# Altium footprint library SMT.PcbLib: 379 footprints (part 12 of 24)
Each footprint in its own frame and in the unit in brackets; x right, y up, seen from the top. Pads: shape width x height; smd on the part's side, far side on the other; paste and mask are expansions set on the pad; w line width, h text height; cw(c..) or ccw(c..) is an arc to the next point about the centre after c.
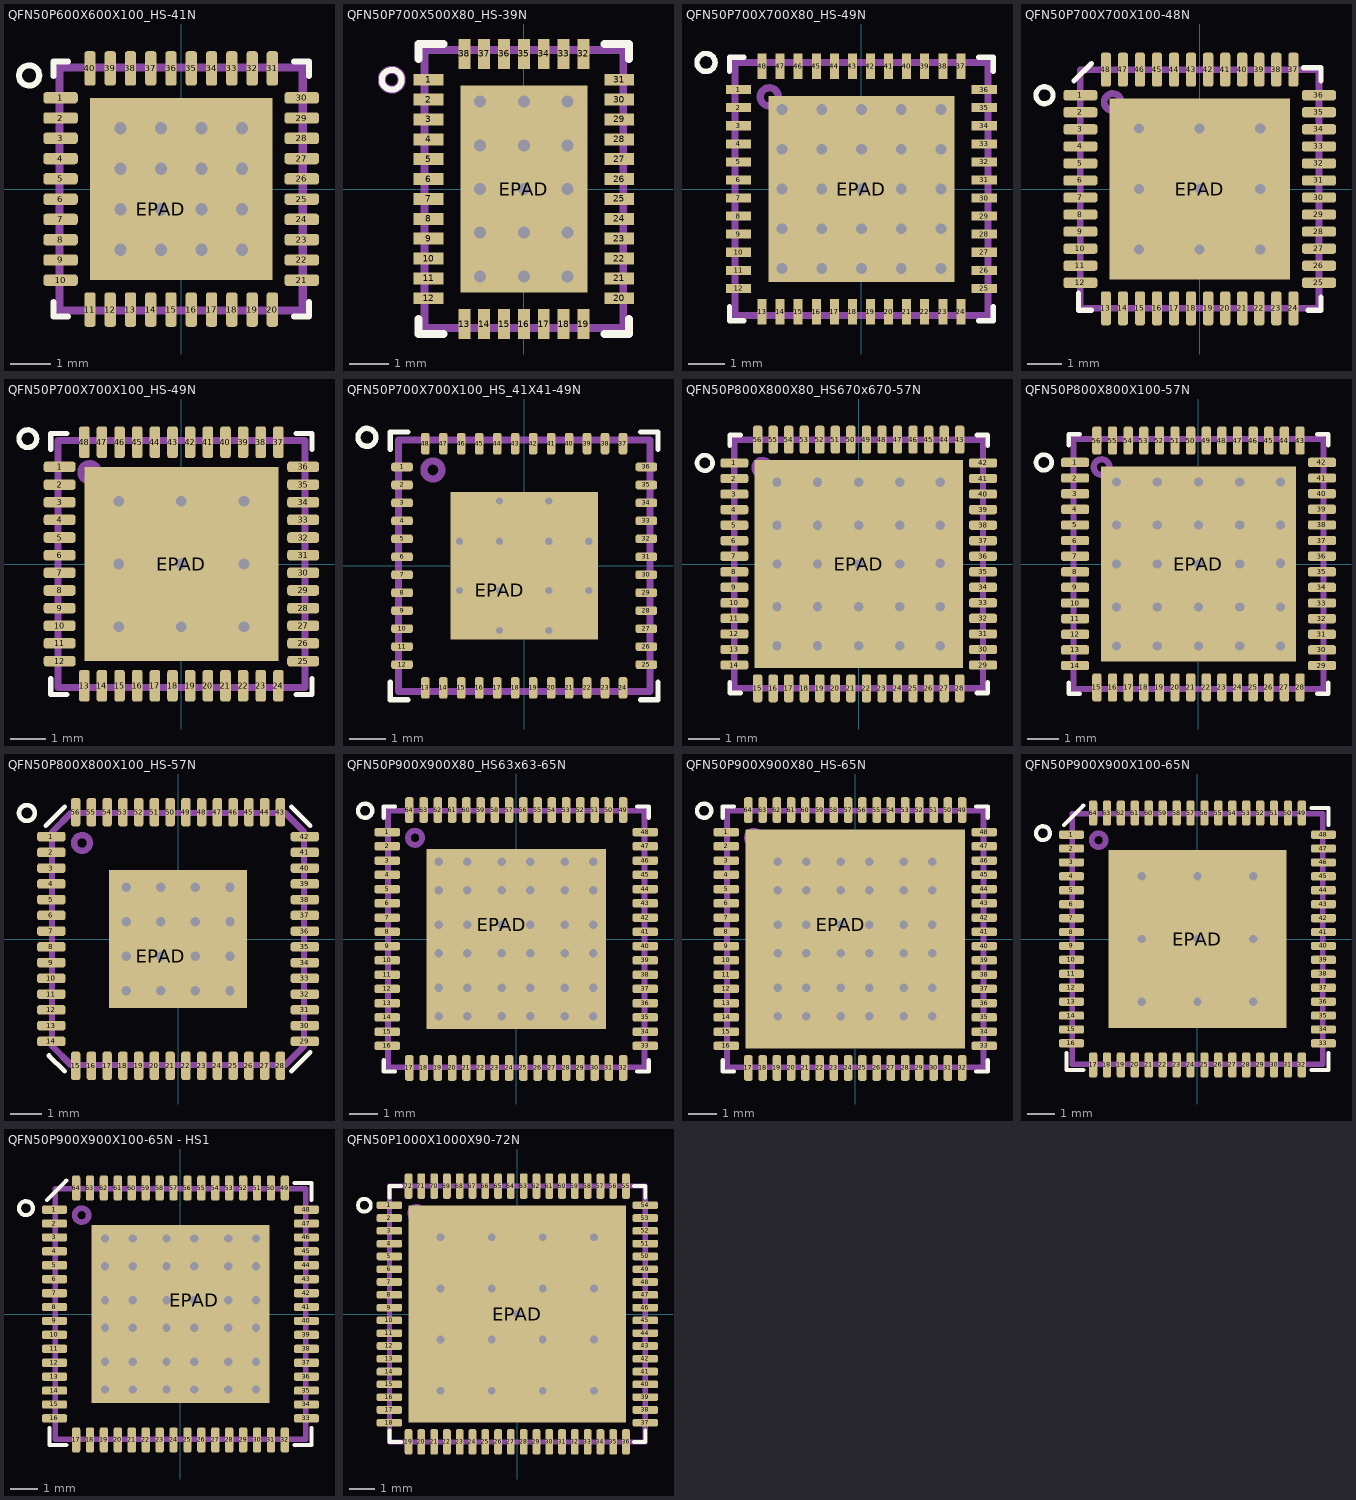
[diagram p11: the footprints below, top view; thin cyan lines are the x and y axes]

## QFN50P600X600X100_HS-41N [mm] "QFN, 40-Leads, Body 6,00x6,00mm, Pitch 0,50mm, Thermal Pad 4,50x4,50mm, IPC Medium Density"
height 1
pads (41):
  rrect50% 0.85x0.28 smd paste-0.025 mask+0.04: 1(-2.975,2.25) 2(-2.975,1.75) 3(-2.975,1.25) 4(-2.975,0.75) 5(-2.975,0.25) 6(-2.975,-0.25) 7(-2.975,-0.75) 8(-2.975,-1.25) 9(-2.975,-1.75) 10(-2.975,-2.25) 21(2.975,-2.25) 22(2.975,-1.75) 23(2.975,-1.25) 24(2.975,-0.75) 25(2.975,-0.25) 26(2.975,0.25) 27(2.975,0.75) 28(2.975,1.25) 29(2.975,1.75) 30(2.975,2.25)
  rrect50% 0.28x0.85 smd paste-0.025 mask+0.04: 11(-2.25,-2.975) 12(-1.75,-2.975) 13(-1.25,-2.975) 14(-0.75,-2.975) 15(-0.25,-2.975) 16(0.25,-2.975) 17(0.75,-2.975) 18(1.25,-2.975) 19(1.75,-2.975) 20(2.25,-2.975) 31(2.25,2.975) 32(1.75,2.975) 33(1.25,2.975) 34(0.75,2.975) 35(0.25,2.975) 36(-0.25,2.975) 37(-0.75,2.975) 38(-1.25,2.975) 39(-1.75,2.975) 40(-2.25,2.975)
  rect 4.5x4.5 hole 0.3 copper offset 0.5,0.5 paste-20 mask-20: EPAD(-0.5,-0.5)
via 1.5,-1.5 diameter 0.7 hole 0.3
via 0.5,-1.5 diameter 0.7 hole 0.3
via -0.5,-1.5 diameter 0.7 hole 0.3
via -1.5,-1.5 diameter 0.7 hole 0.3
via 1.5,-0.5 diameter 0.7 hole 0.3
via 0.5,-0.5 diameter 0.7 hole 0.3
via -1.5,-0.5 diameter 0.7 hole 0.3
via 1.5,0.5 diameter 0.7 hole 0.3
via 0.5,0.5 diameter 0.7 hole 0.3
via -0.5,0.5 diameter 0.7 hole 0.3
via -1.5,0.5 diameter 0.7 hole 0.3
via 1.5,1.5 diameter 0.7 hole 0.3
via 0.5,1.5 diameter 0.7 hole 0.3
via -0.5,1.5 diameter 0.7 hole 0.3
via -1.5,1.5 diameter 0.7 hole 0.3
Top Overlay:
  circle w0.15: c-3.75,2.8 r0.25
  lines w0.15: -3.15,-2.79 -3.15,-3.15 -2.79,-3.15 ; -3.15,2.79 -3.15,3.15 -2.79,3.15 ; 2.79,-3.15 3.15,-3.15 3.15,-2.79 ; 2.79,3.15 3.15,3.15 3.15,2.79
Top Paste:
  rectangle: -0.6,-0.6 0.6,0.6
  rectangle: -0.6,0.9 0.6,2.1
  rectangle: -0.6,-2.1 0.6,-0.9
  rectangle: -2.1,-2.1 -0.9,-0.9
  rectangle: -2.1,0.9 -0.9,2.1
  rectangle: -2.1,-0.6 -0.9,0.6
  rectangle: 0.9,-2.1 2.1,-0.9
  rectangle: 0.9,0.9 2.1,2.1
  rectangle: 0.9,-0.6 2.1,0.6
Top Solder:
  rectangle: -2.15,-2.15 -0.85,-0.85
  rectangle: -0.65,-2.15 0.65,-0.85
  rectangle: 0.85,-2.15 2.15,-0.85
  rectangle: -0.65,-0.65 0.65,0.65
  rectangle: -0.65,0.85 0.65,2.15
  rectangle: -2.15,0.85 -0.85,2.15
  region: -0.85,-0.65 -0.85,0.65 -2.15,0.65 -2.15,-0.65
  region: 2.15,-0.65 2.15,0.65 0.85,0.65 0.85,-0.65
  region: 2.15,2.15 0.85,2.15 0.85,0.85 2.15,0.85
Mechanical 1:
  circle w0.2: c-1.55,1.55 r0.25
  lines w0.2: -3,-3 3,-3 3,3 -3,3 -3,-3
3D body "QFN50P600X600X100_HS-41N.step": height 1, standoff 0, extent -3.001,-3.001 3.001,3.001

## QFN50P700X500X80_HS-39N [mm] "QFN, 38-Leads, Body 7,00x5,00mm, Pitch 0,50mm, Thermal Pad 5,15x3,15mm, IPC Medium Density"
height 0.8
pads (39):
  rect 0.75x0.3 smd mask+0.05: 1(-2.4,2.75) 2(-2.4,2.25) 3(-2.4,1.75) 4(-2.4,1.25) 5(-2.4,0.75) 6(-2.4,0.25) 7(-2.4,-0.25) 8(-2.4,-0.75) 9(-2.4,-1.25) 10(-2.4,-1.75) 11(-2.4,-2.25) 12(-2.4,-2.75) 20(2.4,-2.75) 21(2.4,-2.25) 22(2.4,-1.75) 23(2.4,-1.25) 24(2.4,-0.75) 25(2.4,-0.25) 26(2.4,0.25) 27(2.4,0.75) 28(2.4,1.25) 29(2.4,1.75) 30(2.4,2.25) 31(2.4,2.75)
  rect 0.3x0.75 smd mask+0.05: 13(-1.5,-3.4) 14(-1,-3.4) 15(-0.5,-3.4) 16(0,-3.4) 17(0.5,-3.4) 18(1,-3.4) 19(1.5,-3.4) 32(1.5,3.4) 33(1,3.4) 34(0.5,3.4) 35(0,3.4) 36(-0.5,3.4) 37(-1,3.4) 38(-1.5,3.4)
  rect 3.2x5.2 hole 0.3 mask+0.05: EPAD(0,0)
via -1.1,-2.2 diameter 0.7 hole 0.3
via -1.1,-1.1 diameter 0.7 hole 0.3
via -1.1,0 diameter 0.7 hole 0.3
via -1.1,1.1 diameter 0.7 hole 0.3
via -1.1,2.2 diameter 0.7 hole 0.3
via 0,-2.2 diameter 0.7 hole 0.3
via 0,-1.1 diameter 0.7 hole 0.3
via 0,1.1 diameter 0.7 hole 0.3
via 0,2.2 diameter 0.7 hole 0.3
via 1.1,-2.2 diameter 0.7 hole 0.3
via 1.1,-1.1 diameter 0.7 hole 0.3
via 1.1,0 diameter 0.7 hole 0.3
via 1.1,1.1 diameter 0.7 hole 0.3
via 1.1,2.2 diameter 0.7 hole 0.3
Top Overlay:
  circle w0.15: c-3.325,2.75 r0.25
  lines w0.2: -2.65,-3.275 -2.65,-3.65 -2.025,-3.65 ; -2.65,3.275 -2.65,3.65 -2.025,3.65 ; 2.025,-3.65 2.65,-3.65 2.65,-3.275 ; 2.025,3.65 2.65,3.65 2.65,3.275
Top Paste:
  region: -0.2,-1.225 -0.2,-0.1 -1.275,-0.1 -1.275,-1.225
  region: -0.2,-2.55 -0.2,-1.425 -1.275,-1.425 -1.275,-2.55
  region: 1.275,-1.225 1.275,-0.1 0.2,-0.1 0.2,-1.225
  region: 0.2,1.225 0.2,0.1 1.275,0.1 1.275,1.225
  region: -1.275,1.228 -1.275,0.103 -0.2,0.103 -0.2,1.228
  region: 1.275,-2.55 1.275,-1.425 0.2,-1.425 0.2,-2.55
  region: 0.2,2.55 0.2,1.425 1.275,1.425 1.275,2.55
  region: -1.275,2.553 -1.275,1.428 -0.2,1.428 -0.2,2.553
Mechanical 1:
  circle w0.2: c-3.325,2.75 r0.25
  lines w0.2: -2.5,-3.5 2.5,-3.5 2.5,3.5 -2.5,3.5 -2.5,-3.5
3D body "QFN50P700X500X80_HS-39N.step": height 0.8, standoff 0, extent -2.501,-3.501 2.501,3.501

## QFN50P700X700X80_HS-49N [mm] "QFN, 48-Leads, Body 7,00x7,00mm, Pitch 0,50mm, Thermal Pad 5,15x5,15mm, IPC Medium Density"
height 0.8
pads (49):
  rect 0.7x0.25 smd mask+0.05: 1(-3.4,2.75) 2(-3.4,2.25) 3(-3.4,1.75) 4(-3.4,1.25) 5(-3.4,0.75) 6(-3.4,0.25) 7(-3.4,-0.25) 8(-3.4,-0.75) 9(-3.4,-1.25) 10(-3.4,-1.75) 11(-3.4,-2.25) 12(-3.4,-2.75) 25(3.4,-2.75) 26(3.4,-2.25) 27(3.4,-1.75) 28(3.4,-1.25) 29(3.4,-0.75) 30(3.4,-0.25) 31(3.4,0.25) 32(3.4,0.75) 33(3.4,1.25) 34(3.4,1.75) 35(3.4,2.25) 36(3.4,2.75)
  rect 0.25x0.7 smd mask+0.05: 13(-2.75,-3.4) 14(-2.25,-3.4) 15(-1.75,-3.4) 16(-1.25,-3.4) 17(-0.75,-3.4) 18(-0.25,-3.4) 19(0.25,-3.4) 20(0.75,-3.4) 21(1.25,-3.4) 22(1.75,-3.4) 23(2.25,-3.4) 24(2.75,-3.4) 37(2.75,3.4) 38(2.25,3.4) 39(1.75,3.4) 40(1.25,3.4) 41(0.75,3.4) 42(0.25,3.4) 43(-0.25,3.4) 44(-0.75,3.4) 45(-1.25,3.4) 46(-1.75,3.4) 47(-2.25,3.4) 48(-2.75,3.4)
  rect 5.15x5.15 hole 0.3: EPAD(0,0)
via 2.2,-2.2 diameter 0.6 hole 0.3
via 1.1,-2.2 diameter 0.6 hole 0.3
via 0,-2.2 diameter 0.6 hole 0.3
via -1.1,-2.2 diameter 0.6 hole 0.3
via -2.2,-2.2 diameter 0.6 hole 0.3
via 2.2,-1.1 diameter 0.6 hole 0.3
via 1.1,-1.1 diameter 0.6 hole 0.3
via 0,-1.1 diameter 0.6 hole 0.3
via -1.1,-1.1 diameter 0.6 hole 0.3
via -2.2,-1.1 diameter 0.6 hole 0.3
via 2.2,0 diameter 0.6 hole 0.3
via 1.1,0 diameter 0.6 hole 0.3
via -1.1,0 diameter 0.6 hole 0.3
via -2.2,0 diameter 0.6 hole 0.3
via 2.2,1.1 diameter 0.6 hole 0.3
via 1.1,1.1 diameter 0.6 hole 0.3
via 0,1.1 diameter 0.6 hole 0.3
via -1.1,1.1 diameter 0.6 hole 0.3
via -2.2,1.1 diameter 0.6 hole 0.3
via 2.2,2.2 diameter 0.6 hole 0.3
via 1.1,2.2 diameter 0.6 hole 0.3
via 0,2.2 diameter 0.6 hole 0.3
via -1.1,2.2 diameter 0.6 hole 0.3
via -2.2,2.2 diameter 0.6 hole 0.3
Top Overlay:
  circle w0.15: c-4.3,3.5 r0.25
  lines w0.15: -3.65,-3.25 -3.65,-3.65 -3.25,-3.65 ; -3.65,3.25 -3.65,3.65 -3.25,3.65 ; 3.25,-3.65 3.65,-3.65 3.65,-3.25 ; 3.25,3.65 3.65,3.65 3.65,3.25
Top Paste:
  rectangle: -2.3,-2.3 -0.5,-0.5
  region: 2.3,-0.5 0.5,-0.5 0.5,-2.3 2.3,-2.3
  region: 2.3,2.3 0.5,2.3 0.5,0.5 2.3,0.5
  rectangle: -2.3,0.5 -0.5,2.3
Top Solder:
  rectangle: -2.6,-2.6 -0.2,-0.2
  region: 2.6,-0.2 0.2,-0.2 0.2,-2.6 2.6,-2.6
  region: 2.6,2.6 0.2,2.6 0.2,0.2 2.6,0.2
  rectangle: -2.6,0.2 -0.2,2.6
Mechanical 1:
  circle w0.2: c-2.55,2.55 r0.25
  lines w0.2: -3.5,-3.5 3.5,-3.5 3.5,3.5 -3.5,3.5 -3.5,-3.5
3D body "QFN50P700X700X80_HS-49N.step": height 0.8, standoff 0, extent -3.501,-3.501 3.501,3.501

## QFN50P700X700X100-48N [mm] "QFN, 48-Leads, Body 7,0x7,0mm (max), Pitch 0,50mm, IPC Medium Density"
height 1
pads (49):
  rrect50% 1x0.3 smd mask+0.03: 1(-3.5,2.75) 2(-3.5,2.25) 3(-3.5,1.75) 4(-3.5,1.25) 5(-3.5,0.75) 6(-3.5,0.25) 7(-3.5,-0.25) 8(-3.5,-0.75) 9(-3.5,-1.25) 10(-3.5,-1.75) 11(-3.5,-2.25) 12(-3.5,-2.75) 25(3.5,-2.75) 26(3.5,-2.25) 27(3.5,-1.75) 28(3.5,-1.25) 29(3.5,-0.75) 30(3.5,-0.25) 31(3.5,0.25) 32(3.5,0.75) 33(3.5,1.25) 34(3.5,1.75) 35(3.5,2.25) 36(3.5,2.75)
  rrect50% 0.3x1 smd mask+0.03: 13(-2.75,-3.5) 14(-2.25,-3.5) 15(-1.75,-3.5) 16(-1.25,-3.5) 17(-0.75,-3.5) 18(-0.25,-3.5) 19(0.25,-3.5) 20(0.75,-3.5) 21(1.25,-3.5) 22(1.75,-3.5) 23(2.25,-3.5) 24(2.75,-3.5) 37(2.75,3.5) 38(2.25,3.5) 39(1.75,3.5) 40(1.25,3.5) 41(0.75,3.5) 42(0.25,3.5) 43(-0.25,3.5) 44(-0.75,3.5) 45(-1.25,3.5) 46(-1.75,3.5) 47(-2.25,3.5) 48(-2.75,3.5)
  rect 5.3x5.3 hole 0.3 paste-25 mask-25: EPAD(0,0)
via -1.775,1.775 diameter 0.8 hole 0.3
via 1.775,1.775 diameter 0.8 hole 0.3
via -1.775,-1.775 diameter 0.8 hole 0.3
via 1.775,-1.775 diameter 0.8 hole 0.3
via 1.775,0 diameter 0.8 hole 0.3
via -1.775,0 diameter 0.8 hole 0.3
via 0,1.775 diameter 0.8 hole 0.3
via 0,-1.775 diameter 0.8 hole 0.3
Top Overlay:
  circle w0.15: c-4.55,2.75 r0.25
  lines w0.15: -3.683,3.175 -3.175,3.683 ; -3.556,-3.048 -3.556,-3.556 -3.175,-3.556 ; 3.048,3.556 3.556,3.556 3.556,3.175 ; 3.175,-3.556 3.556,-3.556 3.556,-3.175
Top Paste:
  region: -1.1,1.125 -1.1,2.425 -2.4,2.425 -2.4,1.125
  region: 2.45,1.125 2.45,2.425 1.15,2.425 1.15,1.125
  region: -1.1,-2.425 -1.1,-1.125 -2.4,-1.125 -2.4,-2.425
  region: 2.45,-2.425 2.45,-1.125 1.15,-1.125 1.15,-2.425
  region: 2.45,-0.65 2.45,0.65 1.15,0.65 1.15,-0.65
  region: -1.1,-0.65 -1.1,0.65 -2.4,0.65 -2.4,-0.65
  region: 0.675,1.125 0.675,2.425 -0.625,2.425 -0.625,1.125
  region: 0.675,-0.65 0.675,0.65 -0.625,0.65 -0.625,-0.65
  region: 0.675,-2.425 0.675,-1.125 -0.625,-1.125 -0.625,-2.425
Top Solder:
  region: 2.55,1 2.55,2.5 1.05,2.5 1.05,1
  region: 0.775,1 0.775,2.5 -0.725,2.5 -0.725,1
  region: -1,1 -1,2.5 -2.5,2.5 -2.5,1
  region: -1,-0.775 -1,0.725 -2.5,0.725 -2.5,-0.775
  region: 0.775,-0.775 0.775,0.725 -0.725,0.725 -0.725,-0.775
  region: 2.55,-0.775 2.55,0.725 1.05,0.725 1.05,-0.775
  region: -1,-2.55 -1,-1.05 -2.5,-1.05 -2.5,-2.55
  region: 0.775,-2.55 0.775,-1.05 -0.725,-1.05 -0.725,-2.55
  region: 2.55,-2.55 2.55,-1.05 1.05,-1.05 1.05,-2.55
Bottom Solder:
  region: -2.65,2.65 -2.65,-2.65 2.65,-2.65 2.65,2.65
Mechanical 1:
  circle w0.2: c-2.55,2.55 r0.25
  lines w0.2: -3.5,-3.5 -3.5,3.5 3.5,3.5 3.5,-3.5 -3.5,-3.5
3D body "User Library-QFN48_7x7.STEP": height 0.78, standoff -0.02, extent -3.5,-3.52 3.52,3.5

## QFN50P700X700X100_HS-49N [mm] "QFN, 48-Leads, Body 7,00x7,00mm, Pitch 0,50mm, Thermal Pad 5,50x5,50mm, IPC Medium Density"
height 1
pads (49):
  rrect50% 0.9x0.3 smd mask+0.04: 1(-3.45,2.75) 2(-3.45,2.25) 3(-3.45,1.75) 4(-3.45,1.25) 5(-3.45,0.75) 6(-3.45,0.25) 7(-3.45,-0.25) 8(-3.45,-0.75) 9(-3.45,-1.25) 10(-3.45,-1.75) 11(-3.45,-2.25) 12(-3.45,-2.75) 25(3.45,-2.75) 26(3.45,-2.25) 27(3.45,-1.75) 28(3.45,-1.25) 29(3.45,-0.75) 30(3.45,-0.25) 31(3.45,0.25) 32(3.45,0.75) 33(3.45,1.25) 34(3.45,1.75) 35(3.45,2.25) 36(3.45,2.75)
  rrect50% 0.3x0.9 smd mask+0.04: 13(-2.75,-3.45) 14(-2.25,-3.45) 15(-1.75,-3.45) 16(-1.25,-3.45) 17(-0.75,-3.45) 18(-0.25,-3.45) 19(0.25,-3.45) 20(0.75,-3.45) 21(1.25,-3.45) 22(1.75,-3.45) 23(2.25,-3.45) 24(2.75,-3.45) 37(2.75,3.45) 38(2.25,3.45) 39(1.75,3.45) 40(1.25,3.45) 41(0.75,3.45) 42(0.25,3.45) 43(-0.25,3.45) 44(-0.75,3.45) 45(-1.25,3.45) 46(-1.75,3.45) 47(-2.25,3.45) 48(-2.75,3.45)
  rect 5.5x5.5 hole 0.3 paste-25 mask-25: EPAD(0,0)
via 0,1.775 diameter 0.7 hole 0.3
via 1.775,1.775 diameter 0.7 hole 0.3
via -1.775,0 diameter 0.7 hole 0.3
via 1.775,0 diameter 0.7 hole 0.3
via -1.775,-1.775 diameter 0.7 hole 0.3
via 0,-1.775 diameter 0.7 hole 0.3
via 1.775,-1.775 diameter 0.7 hole 0.3
via -1.775,1.775 diameter 0.7 hole 0.3
Top Overlay:
  circle w0.15: c-4.35,3.55 r0.25
  lines w0.15: -3.7,-3.25 -3.7,-3.7 -3.25,-3.7 ; -3.7,3.25 -3.7,3.7 -3.25,3.7 ; 3.25,-3.7 3.7,-3.7 3.7,-3.25 ; 3.25,3.7 3.7,3.7 3.7,3.25
Top Paste:
  region: 1.075,-1.075 2.475,-1.075 2.475,-2.475 1.075,-2.475
  region: -0.7,-1.075 0.7,-1.075 0.7,-2.475 -0.7,-2.475
  region: -2.475,-1.075 -1.075,-1.075 -1.075,-2.475 -2.475,-2.475
  region: 1.075,0.7 2.475,0.7 2.475,-0.7 1.075,-0.7
  region: -0.7,0.7 0.7,0.7 0.7,-0.7 -0.7,-0.7
  region: -2.475,0.7 -1.075,0.7 -1.075,-0.7 -2.475,-0.7
  region: 1.075,2.475 2.475,2.475 2.475,1.075 1.075,1.075
  region: -0.7,2.475 0.7,2.475 0.7,1.075 -0.7,1.075
  region: -2.475,2.475 -1.075,2.475 -1.075,1.075 -2.475,1.075
Top Solder:
  region: 0.95,-0.95 2.8,-0.95 2.8,-2.8 0.95,-2.8
  region: -0.825,-0.95 0.825,-0.95 0.825,-2.8 -0.825,-2.8
  region: -2.8,-0.95 -0.95,-0.95 -0.95,-2.8 -2.8,-2.8
  region: 0.95,0.825 2.8,0.825 2.8,-0.825 0.95,-0.825
  region: -0.825,0.825 0.825,0.825 0.825,-0.825 -0.825,-0.825
  region: -2.8,0.825 -0.95,0.825 -0.95,-0.825 -2.8,-0.825
  region: 0.95,2.8 2.8,2.8 2.8,0.95 0.95,0.95
  region: -0.825,2.8 0.825,2.8 0.825,0.95 -0.825,0.95
  region: -2.8,2.8 -0.95,2.8 -0.95,0.95 -2.8,0.95
Bottom Solder:
  region: -2.8,2.8 2.8,2.8 2.8,-2.8 -2.8,-2.8
Mechanical 1:
  circle w0.2: c-2.6,2.6 r0.25
  lines w0.2: -3.5,-3.5 -3.5,3.5 3.5,3.5 3.5,-3.5 -3.5,-3.5
3D body "QFN50P700X700X100_HS-49N.step": height 1, standoff 0, extent -3.57,-3.57 3.57,3.57

## QFN50P700X700X100_HS_41X41-49N [mm] "QFN, 48-Leads, Body 7,00x7,00mm, Pitch 0,50mm, Thermal Pad 4,10x4,10mm, IPC Medium Density"
height 1
pads (49):
  rrect50% 0.6x0.24 smd paste+0 mask+0.05: 1(-3.4,2.75) 2(-3.4,2.25) 3(-3.4,1.75) 4(-3.4,1.25) 5(-3.4,0.75) 6(-3.4,0.25) 7(-3.4,-0.25) 8(-3.4,-0.75) 9(-3.4,-1.25) 10(-3.4,-1.75) 11(-3.4,-2.25) 12(-3.4,-2.75) 25(3.4,-2.75) 26(3.4,-2.25) 27(3.4,-1.75) 28(3.4,-1.25) 29(3.4,-0.75) 30(3.4,-0.25) 31(3.4,0.25) 32(3.4,0.75) 33(3.4,1.25) 34(3.4,1.75) 35(3.4,2.25) 36(3.4,2.75)
  rrect50% 0.24x0.6 smd paste+0 mask+0.05: 13(-2.75,-3.4) 14(-2.25,-3.4) 15(-1.75,-3.4) 16(-1.25,-3.4) 17(-0.75,-3.4) 18(-0.25,-3.4) 19(0.25,-3.4) 20(0.75,-3.4) 21(1.25,-3.4) 22(1.75,-3.4) 23(2.25,-3.4) 24(2.75,-3.4) 37(2.75,3.4) 38(2.25,3.4) 39(1.75,3.4) 40(1.25,3.4) 41(0.75,3.4) 42(0.25,3.4) 43(-0.25,3.4) 44(-0.75,3.4) 45(-1.25,3.4) 46(-1.75,3.4) 47(-2.25,3.4) 48(-2.75,3.4)
  rect 4.1x4.1 hole 0.2 copper offset 0.685,0.685: EPAD(-0.685,-0.685)
via 1.8,-0.685 diameter 0.5 hole 0.2
via -1.8,-0.685 diameter 0.5 hole 0.2
via 0.685,-1.8 diameter 0.5 hole 0.2
via 0.685,-0.685 diameter 0.5 hole 0.2
via -0.685,-1.8 diameter 0.5 hole 0.2
via -0.685,1.8 diameter 0.5 hole 0.2
via 0.685,0.685 diameter 0.5 hole 0.2
via 0.685,1.8 diameter 0.5 hole 0.2
via -1.8,0.685 diameter 0.5 hole 0.2
via 1.8,0.685 diameter 0.5 hole 0.2
via -0.685,0.685 diameter 0.5 hole 0.2
Top Overlay:
  circle w0.15: c-4.375,3.575 r0.25
  lines w0.15: -3.725,-3.245 -3.725,-3.725 -3.245,-3.725 ; -3.725,3.245 -3.725,3.725 -3.245,3.725 ; 3.245,-3.725 3.725,-3.725 3.725,-3.245 ; 3.245,3.725 3.725,3.725 3.725,3.245
Top Paste:
  rectangle: -0.585,-0.59 0.585,0.58
  rectangle: -0.585,-1.95 0.585,-0.78
  rectangle: -0.585,0.78 0.585,1.95
  rectangle: 0.785,-1.95 1.955,-0.78
  rectangle: 0.785,0.78 1.955,1.95
  rectangle: 0.785,-0.59 1.955,0.58
  region: -0.785,0.58 -1.955,0.58 -1.955,-0.59 -0.785,-0.59
  region: -0.785,1.95 -1.955,1.95 -1.955,0.78 -0.785,0.78
  region: -0.785,-0.78 -1.955,-0.78 -1.955,-1.95 -0.785,-1.95
Mechanical 1:
  circle w0.2: c-2.54,2.667 r0.25
  lines w0.2: -3.5,-3.5 -3.5,3.5 3.5,3.5 3.5,-3.5 -3.5,-3.5
3D body "QFN50P700X700X100_HS-49N.step": height 1, standoff 0, extent -3.501,-3.501 3.501,3.501

## QFN50P800X800X80_HS670x670-57N [mm] "QFN, 56-Leads, Body 8,00x8,00mm, Pitch 0,50mm, Thermal Pad 6,7x6,7mm, IPC Medium Density"
height 0.8
pads (57):
  rrect50% 0.9x0.3 smd mask+0.03: 1(-4,3.25) 2(-4,2.75) 3(-4,2.25) 4(-4,1.75) 5(-4,1.25) 6(-4,0.75) 7(-4,0.25) 8(-4,-0.25) 9(-4,-0.75) 10(-4,-1.25) 11(-4,-1.75) 12(-4,-2.25) 13(-4,-2.75) 14(-4,-3.25) 29(4,-3.25) 30(4,-2.75) 31(4,-2.25) 32(4,-1.75) 33(4,-1.25) 34(4,-0.75) 35(4,-0.25) 36(4,0.25) 37(4,0.75) 38(4,1.25) 39(4,1.75) 40(4,2.25) 41(4,2.75) 42(4,3.25)
  rrect50% 0.3x0.9 smd mask+0.03: 15(-3.25,-4) 16(-2.75,-4) 17(-2.25,-4) 18(-1.75,-4) 19(-1.25,-4) 20(-0.75,-4) 21(-0.25,-4) 22(0.25,-4) 23(0.75,-4) 24(1.25,-4) 25(1.75,-4) 26(2.25,-4) 27(2.75,-4) 28(3.25,-4) 43(3.25,4) 44(2.75,4) 45(2.25,4) 46(1.75,4) 47(1.25,4) 48(0.75,4) 49(0.25,4) 50(-0.25,4) 51(-0.75,4) 52(-1.25,4) 53(-1.75,4) 54(-2.25,4) 55(-2.75,4) 56(-3.25,4)
  rect 6.7x6.7 hole 0.3 paste+0 mask-5: EPAD(0,0)
via 2.625,0.025 diameter 0.6 hole 0.3
via 1.325,0 diameter 0.6 hole 0.3
via 2.625,2.625 diameter 0.6 hole 0.3
via 2.625,-2.625 diameter 0.6 hole 0.3
via 2.625,-1.375 diameter 0.6 hole 0.3
via 2.625,1.25 diameter 0.6 hole 0.3
via 1.325,2.625 diameter 0.6 hole 0.3
via 1.325,-2.625 diameter 0.6 hole 0.3
via 1.325,-1.375 diameter 0.6 hole 0.3
via 1.325,1.25 diameter 0.6 hole 0.3
via 0,1.25 diameter 0.6 hole 0.3
via 0,-1.375 diameter 0.6 hole 0.3
via -2.625,-1.375 diameter 0.6 hole 0.3
via -2.625,1.25 diameter 0.6 hole 0.3
via -1.325,2.625 diameter 0.6 hole 0.3
via -1.325,0 diameter 0.6 hole 0.3
via -1.325,-1.375 diameter 0.6 hole 0.3
via -2.625,2.625 diameter 0.6 hole 0.3
via -2.625,-2.625 diameter 0.6 hole 0.3
via 0,-2.625 diameter 0.6 hole 0.3
via 0,2.625 diameter 0.6 hole 0.3
via -2.625,0 diameter 0.6 hole 0.3
via -1.325,-2.625 diameter 0.6 hole 0.3
via -1.325,1.25 diameter 0.6 hole 0.3
Top Overlay:
  circle w0.15: c-4.95,3.25 r0.25
  lines w0.15: -4.15,-3.8 -4.15,-4.15 -3.8,-4.15 ; -4.15,3.8 -4.15,4.15 -3.8,4.15 ; 3.8,-4.15 4.15,-4.15 4.15,-3.8 ; 3.8,4.15 4.15,4.15 4.15,3.8
Top Paste:
  region: 3.075,-0.45 3.075,0.45 2.175,0.45 2.175,-0.45
  region: 3.075,2.175 3.075,3.075 2.175,3.075 2.175,2.175
  region: 3.075,-3.075 3.075,-2.175 2.175,-2.175 2.175,-3.075
  region: 3.075,-1.825 3.075,-0.925 2.175,-0.925 2.175,-1.825
  region: 3.075,0.8 3.075,1.7 2.175,1.7 2.175,0.8
  region: 1.775,-0.45 1.775,0.45 0.875,0.45 0.875,-0.45
  region: 1.775,2.175 1.775,3.075 0.875,3.075 0.875,2.175
  region: 1.775,-3.075 1.775,-2.175 0.875,-2.175 0.875,-3.075
  region: 1.775,-1.825 1.775,-0.925 0.875,-0.925 0.875,-1.825
  region: 1.775,0.8 1.775,1.7 0.875,1.7 0.875,0.8
  region: 0.45,0.8 0.45,1.7 -0.45,1.7 -0.45,0.8
  region: 0.45,-1.825 0.45,-0.925 -0.45,-0.925 -0.45,-1.825
  region: -2.175,-1.825 -2.175,-0.925 -3.075,-0.925 -3.075,-1.825
  region: -2.175,0.8 -2.175,1.7 -3.075,1.7 -3.075,0.8
  region: -0.875,2.175 -0.875,3.075 -1.775,3.075 -1.775,2.175
  region: -0.875,-0.45 -0.875,0.45 -1.775,0.45 -1.775,-0.45
  region: -0.875,-1.825 -0.875,-0.925 -1.775,-0.925 -1.775,-1.825
  region: -0.875,0.8 -0.875,1.7 -1.775,1.7 -1.775,0.8
  region: -2.175,2.175 -2.175,3.075 -3.075,3.075 -3.075,2.175
  region: -2.175,-3.075 -2.175,-2.175 -3.075,-2.175 -3.075,-3.075
  region: 0.45,-3.075 0.45,-2.175 -0.45,-2.175 -0.45,-3.075
  region: 0.45,2.175 0.45,3.075 -0.45,3.075 -0.45,2.175
  region: -2.175,-0.45 -2.175,0.45 -3.075,0.45 -3.075,-0.45
  region: 0.45,-0.45 0.45,0.45 -0.45,0.45 -0.45,-0.45
  region: -0.875,-3.075 -0.875,-2.175 -1.775,-2.175 -1.775,-3.075
Top Solder:
  region: 3.125,-0.5 3.125,0.5 2.125,0.5 2.125,-0.5
  region: 3.125,2.125 3.125,3.125 2.125,3.125 2.125,2.125
  region: 3.125,-3.125 3.125,-2.125 2.125,-2.125 2.125,-3.125
  region: 3.125,-1.875 3.125,-0.875 2.125,-0.875 2.125,-1.875
  region: 3.125,0.75 3.125,1.75 2.125,1.75 2.125,0.75
  region: 1.825,-0.5 1.825,0.5 0.825,0.5 0.825,-0.5
  region: 1.825,2.125 1.825,3.125 0.825,3.125 0.825,2.125
  region: 1.825,-3.125 1.825,-2.125 0.825,-2.125 0.825,-3.125
  region: 1.825,-1.875 1.825,-0.875 0.825,-0.875 0.825,-1.875
  region: 1.825,0.75 1.825,1.75 0.825,1.75 0.825,0.75
  region: 0.5,0.75 0.5,1.75 -0.5,1.75 -0.5,0.75
  region: 0.5,-1.875 0.5,-0.875 -0.5,-0.875 -0.5,-1.875
  region: -2.125,-1.875 -2.125,-0.875 -3.125,-0.875 -3.125,-1.875
  region: -2.125,0.75 -2.125,1.75 -3.125,1.75 -3.125,0.75
  region: -0.825,2.125 -0.825,3.125 -1.825,3.125 -1.825,2.125
  region: -0.825,-0.5 -0.825,0.5 -1.825,0.5 -1.825,-0.5
  region: -0.825,-1.875 -0.825,-0.875 -1.825,-0.875 -1.825,-1.875
  region: -0.825,0.75 -0.825,1.75 -1.825,1.75 -1.825,0.75
  region: -2.125,2.125 -2.125,3.125 -3.125,3.125 -3.125,2.125
  region: -2.125,-3.125 -2.125,-2.125 -3.125,-2.125 -3.125,-3.125
  region: 0.5,-3.125 0.5,-2.125 -0.5,-2.125 -0.5,-3.125
  region: 0.5,2.125 0.5,3.125 -0.5,3.125 -0.5,2.125
  region: -2.125,-0.5 -2.125,0.5 -3.125,0.5 -3.125,-0.5
  region: -0.825,-3.125 -0.825,-2.125 -1.825,-2.125 -1.825,-3.125
  region: 0.5,-0.5 0.5,0.5 -0.5,0.5 -0.5,-0.5
Bottom Solder:
  region: 3.175,-3.175 3.175,3.175 -3.175,3.175 -3.175,-3.175
Mechanical 1:
  circle w0.2: c-3.1,3.1 r0.25
  lines w0.2: -4,-4 -4,4 4,4 4,-4 -4,-4
3D body "QFN56-8X8-5_2.STEP": height 0.92, standoff 0.02, extent -4,-4 4,4
